# Altium footprint library PCBLIB.PcbLib: 775 footprints (part 30 of 49)
Each footprint in its own frame and in the unit in brackets; x right, y up, seen from the top. Pads: shape width x height; smd on the part's side, far side on the other; paste and mask are expansions set on the pad; w line width, h text height; cw(c..) or ccw(c..) is an arc to the next point about the centre after c.
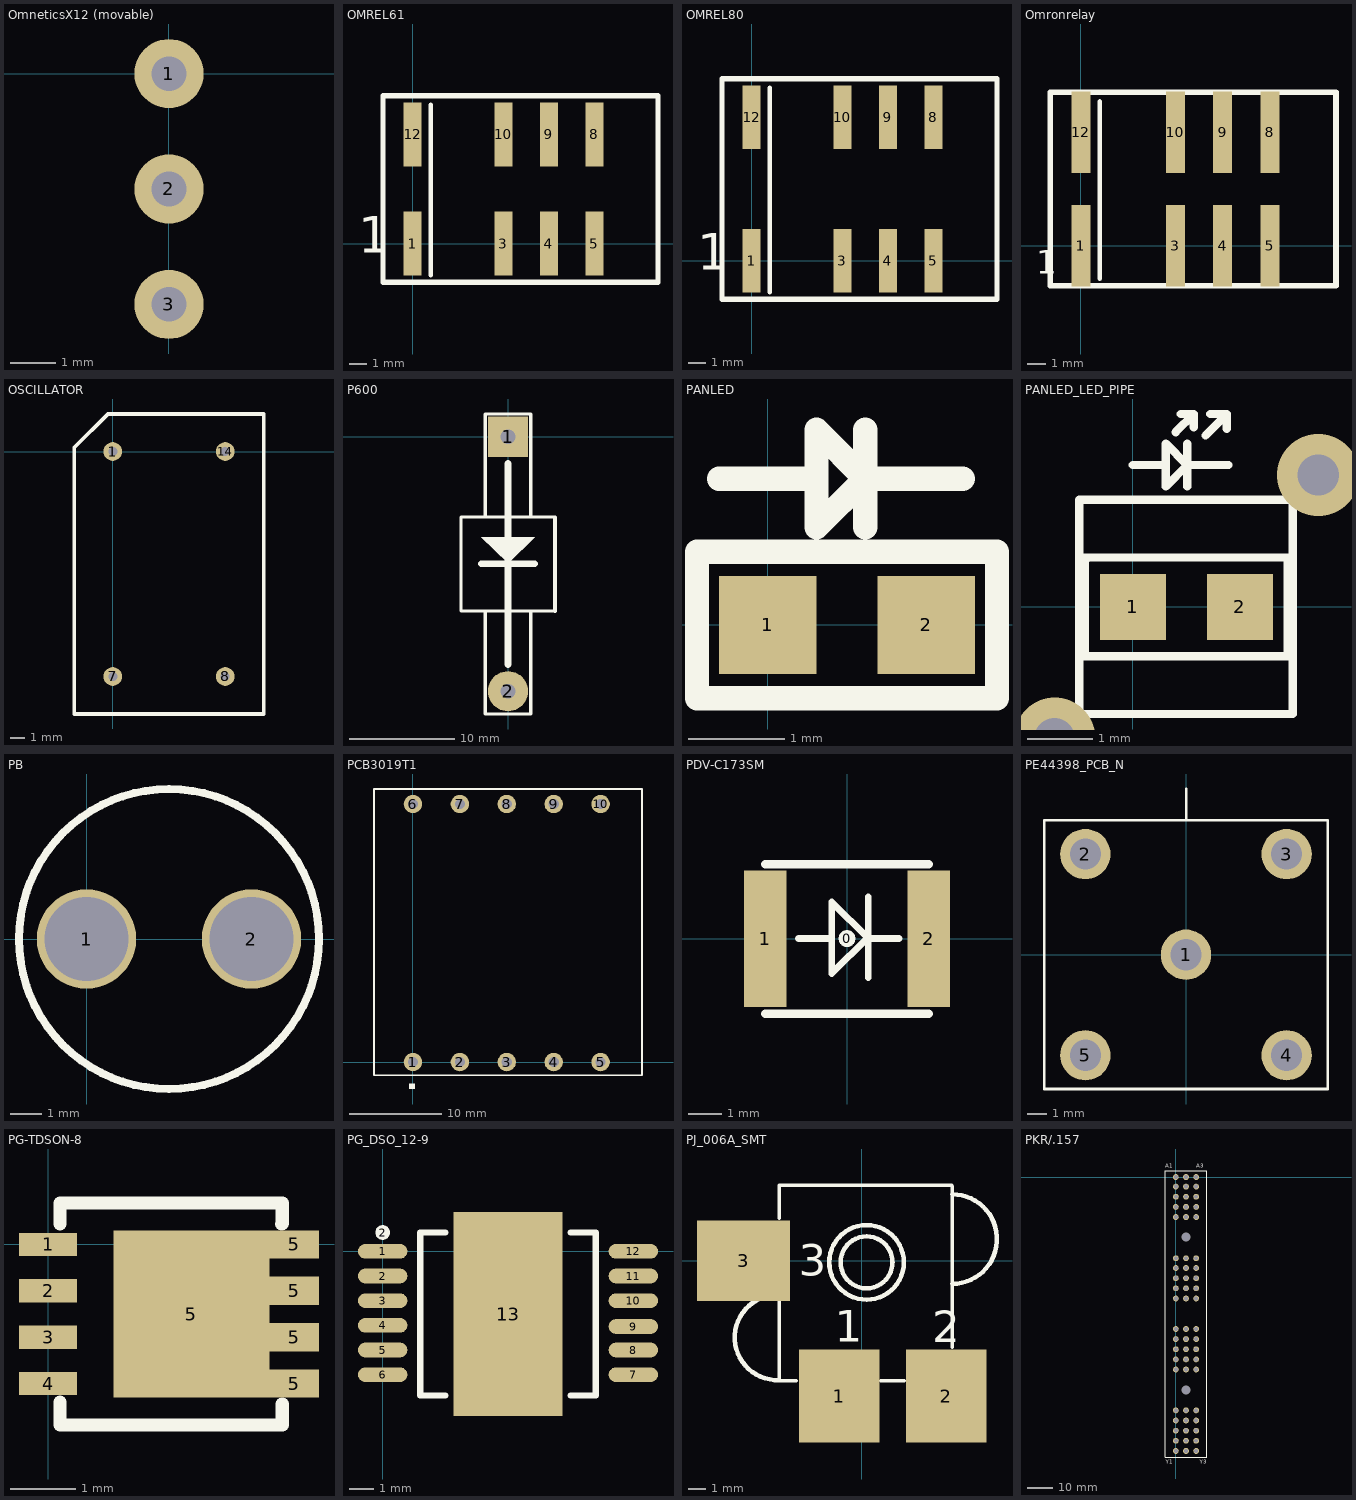
[diagram p29: the footprints below, top view; thin cyan lines are the x and y axes]

## OmneticsX12 (movable) [mil]
height 20
pads (3):
  round 60 hole 30: 1(0,0) 2(0,-100) 3(0,-200)

## OMREL61 [mil]
pads (8):
  rect 40x140 smd: 1(0,0) 3(200,0) 4(300,0) 5(400,0) 8(400,240) 9(300,240) 10(200,240) 12(0,240)
TopOverlay:
  lines w10: 40,-70 40,305
  lines w12: -65,-85 540,-85 540,325 -65,325 -65,-85
  text "1" at -120,-20 h80
Mechanical4:
  text ".375" at 0,0 h1

## OMREL80 [mil]
pads (8):
  rect 40x140 smd: 1(0,0) 3(200,0) 4(300,0) 5(400,0) 8(400,315) 9(300,315) 10(200,315) 12(0,315)
TopOverlay:
  lines w10: 40,-70 40,380
  lines w12: -65,-85 540,-85 540,400 -65,400 -65,-85
  text "1" at -120,-20 h80
Mechanical4:
  text ".375" at 0,0 h1

## Omronrelay [mil]
pads (8):
  rect 40x173.23 smd: 1(0,0) 3(200,0) 4(300,0) 5(400,0) 8(400,240) 9(300,240) 10(200,240) 12(0,240)
TopOverlay:
  lines w10: 40,-70 40,305
  lines w12: -65,-85 -65,325 540,325 540,-85 -65,-85
  text "1" at -95,-59 h50
Mechanical4:
  text ".375" at 0,0 h1

## OSCILLATOR [mil]
pads (4):
  round 50 hole 24: 1(0,0) 7(0,-600) 8(300,-600) 14(300,0)
TopOverlay:
  lines w10: -103,-700 403,-700 403,100 -10,100 -13,100 -103,10 -103,-700
  text "." at -87,68 h60
Mechanical4:
  text ".225" at 0,0 h1

## P600 [mil]
pads (2):
  rect 150x150 hole 55: 1(0,0)
  round 150 hole 55.12: 2(0,-950)
TopOverlay:
  region: 0.34,-472.41 -99,-375.33 99.67,-375.33
  lines w11.81: -174.32,-300 -175,-300 ; -85,-650 -85,-1035 85,-1035 85,-650 ; -85,-300 -85,85 85,85 85,-300 ; -0.41,-473.91 0.34,-474.66 ; 175,-650 -175,-650 -175,-300 ; 175,-300 -175,-300
  lines w14: 175,-650 175,-300
  lines w25: -100,-473.91 -0.41,-473.91 100,-473.91 ; 0.34,-850 0.34,-100

## PANLED [mil]
pads (2):
  rect 40x40 smd: 1(0,0) 2(64.96,0)
TopOverlay:
  lines w10: -29,28 -27,30 ; -20,60 20,60 ; 40,40 40,60 ; 40,80 40,60 ; 80,60 60,60 40,60 ; 20,60 20,80 40,60 ; 20,60 20,40 40,60 ; -29,-30 0,-30 60,-30 94,-30 94,-21 94,30 60,30 0,30 -29,30 -29,-30
Mechanical4:
  text ".031" at 64.96,0 h1
  text ".031" at 0,0 h1

## PANLED_LED_PIPE [mil]
pads (2):
  rect 40x40 smd: 1(0,0) 2(64.96,0)
via -47.52,-80 diameter 50 hole 25
via 112.48,80 diameter 50 hole 25
TopOverlay:
  lines w5: -29,28 -27,30 ; 0,86 20,86 ; 26,106 37,117 ; 29,117 37,117 ; 32.95,85.94 32.95,86.06 20,99 20,86 ; 33,73 33,86 ; 33,99 33,86 ; 37,109 37,117 ; 44,104 57,117 ; 47,117 57,117 ; 57,108 57,117 ; 58,86 33,86 ; 20,86 20,73 33,86 ; -32.52,-65 97,-65 97,65 -32.52,65 -32.52,-65 ; -29,-30 -29,30 0,30 60,30 94,30 94,-21 94,-30 60,-30 0,-30 -29,-30
Mechanical4:
  text ".031" at 0,0 h1
  text ".031" at 64.96,0 h1

## PB [mil]
pads (2):
  round 126 hole 106: 1(0,0) 2(209,0)
TopOverlay:
  circle w10: c104.5,0 r190
Mechanical4:
  text ".930" at 0,0 h1

## PCB3019T1 [mm] "Transformer"
pads (10):
  round 2 hole 1.1: 1(0,0) 2(5.08,0) 3(10.16,0) 4(15.24,0) 5(20.32,0) 6(0,27.94) 7(5.08,27.94) 8(10.16,27.94) 9(15.24,27.94) 10(20.32,27.94)
TopOverlay:
  rectangle: -0.432,-2.921 0.229,-2.311
  lines w0.203: -4.21,-1.434 24.79,-1.434 24.79,29.566 -4.21,29.566 -4.21,-1.434

## PDV-C173SM [mil] "Photodiode"
height 0.05
pads (3):
  round 20 on Top Overlay: 0(0,0)
  rect 50x160 smd: 1(-96,0) 2(96,0)
TopOverlay:
  lines w8: -57,0 -18,0 ; 25,-46 25,49 ; 25,2 -18,-41 -18,43 25,0 61,0
  lines w10: -96,-88 96,-88 ; -96,87 96,87
Mechanical4:
  text ".040" at -231,0 h1

## PE44398_PCB_N [mil]
height 980
pads (5):
  round 100 hole 62: 1(0,0) 2(-200,200) 3(200,200) 4(200,-200) 5(-200,-200)
TopOverlay:
  lines w5: 0.41,267 0.41,329.33 ; -282,-267 -282,267 282,267 282,-267 -282,-267

## PG-TDSON-8 [mil]
height 39
pads (9):
  rect 35x14 smd: 1(0,0) 2(0,-28) 3(0,-56) 4(0,-84)
  rect 94x101 smd: 5(86.5,-42)
  rect 30x17 smd: 5(148.5,-84) 5(148.5,-56) 5(148.5,-28) 5(148.5,0)
TopOverlay:
  lines w8: 7.3,-95.06 7.25,-95.11 7.25,-109 141.25,-109 141.25,-96.34 141.26,-96.33 ; 7.3,12.36 7.25,12.41 7.25,25 141.25,25 141.25,12.56 141.05,12.36
  text "." at -25.55,12.78 h250

## PG_DSO_12-9 [mm]
height 10
pads (14):
  oval 2x0.6 smd: 1(0,0) 2(0,-1) 3(0,-2) 4(0,-3) 5(0,-4) 6(0,-5) 7(10.16,-5) 8(10.16,-4) 9(10.16,-3.048) 10(10.16,-2) 11(10.16,-1) 12(10.16,0)
  round 0.6 on Top Overlay: 2(0,0.762)
  rect 4.4x8.255 smd: 13(5.08,-2.54)
TopOverlay:
  lines w0.254: 2.54,-5.842 1.524,-5.842 1.524,0.762 2.54,0.762 ; 7.62,-5.842 8.636,-5.842 8.636,0.762 7.62,0.762

## PJ_006A_SMT [mm]
height 14.148
pads (3):
  rect 4.5x5.211 smd: 1(-1.25,-7.575) 2(4.75,-7.575)
  rect 5.211x4.5 smd: 3(-6.594,0)
TopOverlay:
  circle w0.254: c0.28,-0.1 r1.451
  circle w0.254: c0.28,-0.1 r2.086
  lines w0.203: -4.603,-1.921 -4.6,-6.725 -3.643,-6.725 ; -4.6,2.382 -4.6,4.203 2.862,4.203 4.273,4.203 ; 1.092,-6.725 2.388,-6.725 ; 5.074,-4.854 5.074,4.163 5.034,4.203 4.273,4.203 ; 4.273,4.203 4.273,4.203
  lines w0.254: -4.603,-1.921 ccw(c-4.704,-4.303) -4.602,-6.685 ; 5.074,-1.301 ccw(c5.074,1.201) 5.074,3.703
  text "3" at -3.513,-0.861 h1.78
  text "2" at 3.943,-4.573 h1.78
  text "1" at -1.491,-4.533 h1.78

## PKR/.157 [mil]
pads (62):
  round 70 hole 140: 61(157,-3299) 63(157,-929)
  round 90 hole 60: A1(0,0) A2(157,0) A3(314,0) B1(0,-148) B2(157,-148) B3(314,-148) C1(0,-305) C2(157,-305) C3(314,-305) D1(0,-462) D2(157,-462) D3(314,-462) E1(0,-619) E2(157,-619) E3(314,-619) F1(0,-1256) F2(157,-1256) F3(314,-1256) G1(0,-1408) G2(157,-1408) G3(314,-1408) H1(0,-1565) H2(157,-1565) H3(314,-1565) J1(0,-1722) J2(157,-1722) J3(314,-1722) K1(0,-1879) K2(157,-1879) K3(314,-1879) L1(0,-2351) L2(157,-2351) L3(314,-2351) M1(0,-2508) M2(157,-2508) M3(314,-2508) N1(0,-2665) N2(157,-2665) N3(314,-2665) P1(0,-2822) P2(157,-2822) P3(314,-2822) R1(0,-2979) R2(157,-2979) R3(314,-2979) S1(0,-3611) S2(157,-3611) S3(314,-3611) T1(0,-3768) T2(157,-3768) T3(314,-3768) W1(0,-3925) W2(157,-3925) W3(314,-3925) X1(0,-4082) X2(157,-4082) X3(314,-4082) Y1(0,-4239) Y2(157,-4239) Y3(314,-4239)
TopOverlay:
  lines w10: -168,-4339 482,-4339 482,100 -168,100 -168,-4339
  text "A3" at 317,142 h60
  text "A1" at -168,142 h60
  text "Y1" at -154,-4441 h60
  text "Y3" at 367,-4441 h60
Mechanical4:
  text "2.0" at 0,0 h1
  text "1.220" at 314,-4239 h1